# Altium integrated library MM70-314-310B1-1-R300.IntLib: 1 symbol
Pins are listed as number, name and electrical type; pins without a type are passive.

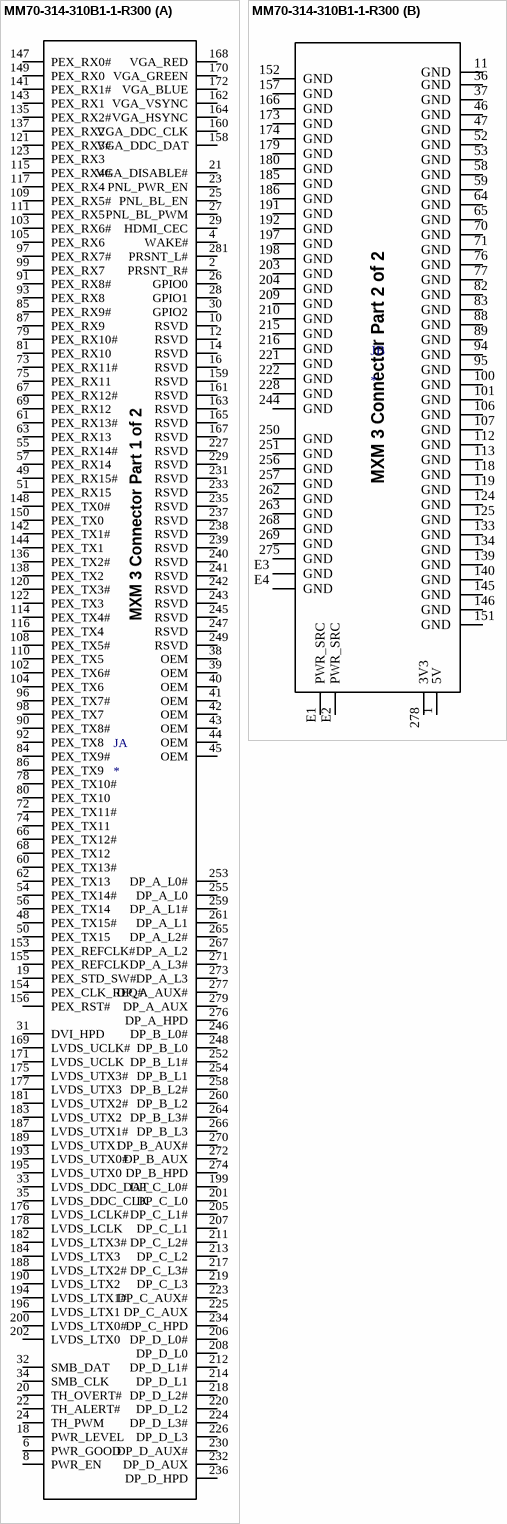
[diagram p0: symbol MM70-314-310B1-1-R300]

## MM70-314-310B1-1-R300
designator J
314 Position Female Connector MXM 3.0 Gold 0.020 _0.50mm_ Black; MF: JAE Electronics; MP: MM70-314-310B1-1-R300; Package: None; Digi-Key_Part_Number: 670-2431-1-ND; Digi-Key_Purchase_URL: https://www.digikey.com/product-detail/en/jae-electronics/MM70-314-310B1-1-R300/670-2431-1-ND/2183605?utm_source=snapeda&utm_medium=aggregator&utm_campaign=symbol; Value: *; SnapEDA_Link: https://www.snapeda.com/parts/MM70-314-310B1-1-R300/JAE%20Electronics/view-part/553386/?ref=snap
footprint JAE_MM70-314-310B1-2-R300
part A pins: 2 PRSNT_R#, 4 WAKE#, 6 PWR_GOOD, 8 PWR_EN, 10 RSVD, 12 RSVD, 14 RSVD, 16 RSVD, 18 PWR_LEVEL, 19 PEX_STD_SW#, 20 TH_OVERT#, 21 VGA_DISABLE#, 22 TH_ALERT#, 23 PNL_PWR_EN, 24 TH_PWM, 25 PNL_BL_EN, 26 GPIO0, 27 PNL_BL_PWM, 28 GPIO1, 29 HDMI_CEC, 30 GPIO2, 31 DVI_HPD, 32 SMB_DAT, 33 LVDS_DDC_DAT, 34 SMB_CLK, 35 LVDS_DDC_CLK, 38 OEM, 39 OEM, 40 OEM, 41 OEM, 42 OEM, 43 OEM, 44 OEM, 45 OEM, 48 PEX_TX15#, 49 PEX_RX15#, 50 PEX_TX15, 51 PEX_RX15, 54 PEX_TX14#, 55 PEX_RX14#, 56 PEX_TX14, 57 PEX_RX14, 60 PEX_TX13#, 61 PEX_RX13#, 62 PEX_TX13, 63 PEX_RX13, 66 PEX_TX12#, 67 PEX_RX12#, 68 PEX_TX12, 69 PEX_RX12, 72 PEX_TX11#, 73 PEX_RX11#, 74 PEX_TX11, 75 PEX_RX11, 78 PEX_TX10#, 79 PEX_RX10#, 80 PEX_TX10, 81 PEX_RX10, 84 PEX_TX9#, 85 PEX_RX9#, 86 PEX_TX9, 87 PEX_RX9, 90 PEX_TX8#, 91 PEX_RX8#, 92 PEX_TX8, 93 PEX_RX8, 96 PEX_TX7#, 97 PEX_RX7#, 98 PEX_TX7, 99 PEX_RX7, 102 PEX_TX6#, 103 PEX_RX6#, 104 PEX_TX6, 105 PEX_RX6, 108 PEX_TX5#, 109 PEX_RX5#, 110 PEX_TX5, 111 PEX_RX5, 114 PEX_TX4#, 115 PEX_RX4#, 116 PEX_TX4, 117 PEX_RX4, 120 PEX_TX3#, 121 PEX_RX3#, 122 PEX_TX3, 123 PEX_RX3, 135 PEX_RX2#, 136 PEX_TX2#, 137 PEX_RX2, 138 PEX_TX2, 141 PEX_RX1#, 142 PEX_TX1#, 143 PEX_RX1, 144 PEX_TX1, 147 PEX_RX0#, 148 PEX_TX0#, 149 PEX_RX0, 150 PEX_TX0, 153 PEX_REFCLK#, 154 PEX_CLK_REQ#, 155 PEX_REFCLK, 156 PEX_RST#, 158 VGA_DDC_DAT, 159 RSVD, 160 VGA_DDC_CLK, 161 RSVD, 162 VGA_VSYNC, 163 RSVD, 164 VGA_HSYNC, 165 RSVD, 167 RSVD, 168 VGA_RED, 169 LVDS_UCLK#, 170 VGA_GREEN, 171 LVDS_UCLK, 172 VGA_BLUE, 175 LVDS_UTX3#, 176 LVDS_LCLK#, 177 LVDS_UTX3, 178 LVDS_LCLK, 181 LVDS_UTX2#, 182 LVDS_LTX3#, 183 LVDS_UTX2, 184 LVDS_LTX3, 187 LVDS_UTX1#, 188 LVDS_LTX2#, 189 LVDS_UTX1, 190 LVDS_LTX2, 193 LVDS_UTX0#, 194 LVDS_LTX1#, 195 LVDS_UTX0, 196 LVDS_LTX1, 199 DP_C_L0#, 200 LVDS_LTX0#, 201 DP_C_L0, 202 LVDS_LTX0, 205 DP_C_L1#, 206 DP_D_L0#, 207 DP_C_L1, 208 DP_D_L0, 211 DP_C_L2#, 212 DP_D_L1#, 213 DP_C_L2, 214 DP_D_L1, 217 DP_C_L3#, 218 DP_D_L2#, 219 DP_C_L3, 220 DP_D_L2, 223 DP_C_AUX#, 224 DP_D_L3#, 225 DP_C_AUX, 226 DP_D_L3, 227 RSVD, 229 RSVD, 230 DP_D_AUX#, 231 RSVD, 232 DP_D_AUX, 233 RSVD, 234 DP_C_HPD, 235 RSVD, 236 DP_D_HPD, 237 RSVD, 238 RSVD, 239 RSVD, 240 RSVD, 241 RSVD, 242 RSVD, 243 RSVD, 245 RSVD, 246 DP_B_L0#, 247 RSVD, 248 DP_B_L0, 249 RSVD, 252 DP_B_L1#, 253 DP_A_L0#, 254 DP_B_L1, 255 DP_A_L0, 258 DP_B_L2#, 259 DP_A_L1#, 260 DP_B_L2, 261 DP_A_L1, 264 DP_B_L3#, 265 DP_A_L2#, 266 DP_B_L3, 267 DP_A_L2, 270 DP_B_AUX#, 271 DP_A_L3#, 272 DP_B_AUX, 273 DP_A_L3, 274 DP_B_HPD, 276 DP_A_HPD, 277 DP_A_AUX#, 279 DP_A_AUX, 281 PRSNT_L#
part B pins: 1 5V, 11 GND, 36 GND, 37 GND, 46 GND, 47 GND, 52 GND, 53 GND, 58 GND, 59 GND, 64 GND, 65 GND, 70 GND, 71 GND, 76 GND, 77 GND, 82 GND, 83 GND, 88 GND, 89 GND, 94 GND, 95 GND, 100 GND, 101 GND, 106 GND, 107 GND, 112 GND, 113 GND, 118 GND, 119 GND, 124 GND, 125 GND, 133 GND, 134 GND, 139 GND, 140 GND, 145 GND, 146 GND, 151 GND, 152 GND, 157 GND, 166 GND, 173 GND, 174 GND, 179 GND, 180 GND, 185 GND, 186 GND, 191 GND, 192 GND, 197 GND, 198 GND, 203 GND, 204 GND, 209 GND, 210 GND, 215 GND, 216 GND, 221 GND, 222 GND, 228 GND, 244 GND, 250 GND, 251 GND, 256 GND, 257 GND, 262 GND, 263 GND, 268 GND, 269 GND, 275 GND, 278 3V3,  E3    GND,  E4    GND, E1 PWR_SRC, E2 PWR_SRC
part A text: MXM 3 Connector Part 1 of 2
part B text: MXM 3 Connector Part 2 of 2